# Altium footprint library Capacitor.PcbLib: 119 footprints (part 1 of 8)
Each footprint in its own frame and in the unit in brackets; x right, y up, seen from the top. Pads: shape width x height; smd on the part's side, far side on the other; paste and mask are expansions set on the pad; w line width, h text height; cw(c..) or ccw(c..) is an arc to the next point about the centre after c.
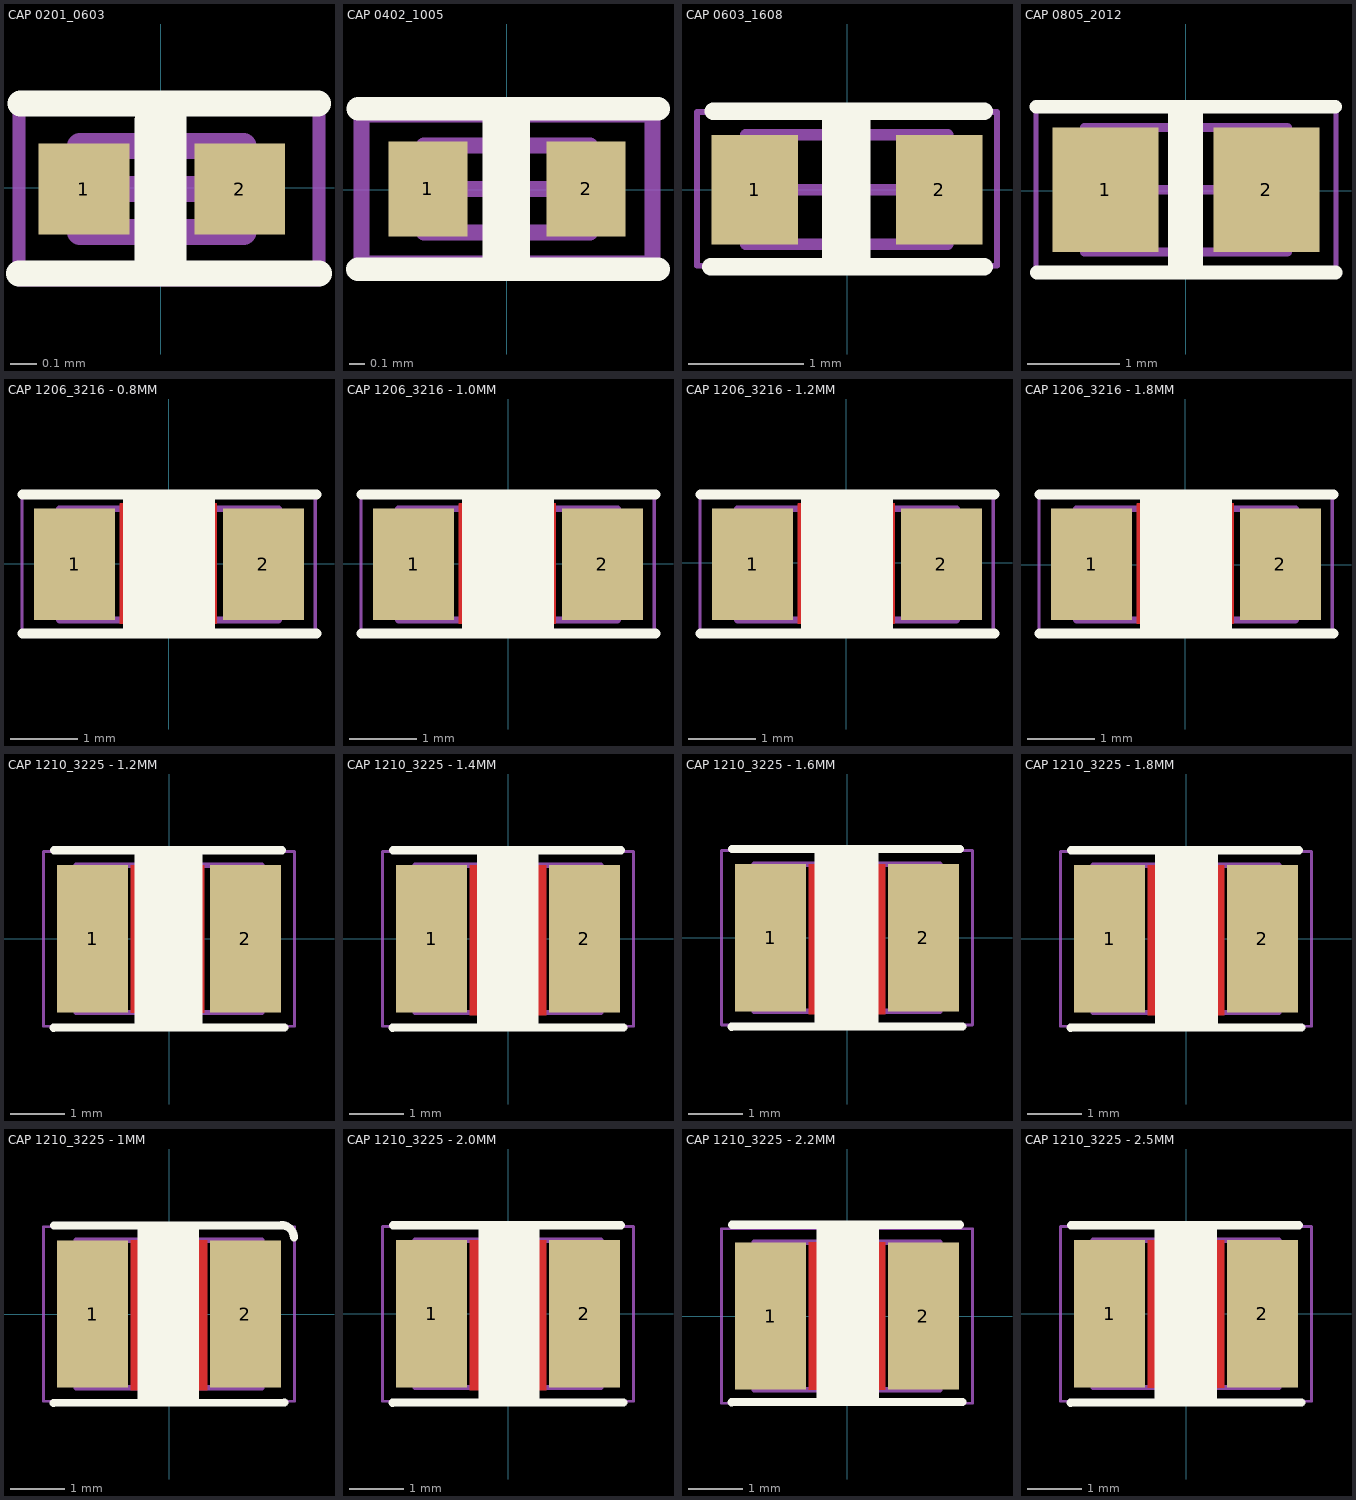
[diagram p0: the footprints below, top view; thin cyan lines are the x and y axes]

## CAP 0201_0603 [mm] "Chip Capacitor, 2-Leads, Body 0.60x0.30mm, IPC Medium Density"
height 0.33
pads (2):
  rect 0.35x0.35 smd: 1(-0.295,-0.004) 2(0.305,-0.004)
Top Overlay:
  lines w0.1: -0.545,-0.329 0.61,-0.329 ; -0.54,0.326 0.606,0.326 0.235,0.326 ; -0.05,-0.31 -0.05,0.26 -0.02,0.29 ; 0,-0.28 0,0.32 ; 0.05,-0.31 0.05,0.27
Mechanical 13:
  lines w0.1: -0.31,-0.169 -0.31,0.161 0.32,0.161 0.32,-0.169 -0.31,-0.169
Mechanical 15:
  lines w0.05: -0.545,-0.354 0.61,-0.354 0.61,0.346 -0.545,0.346 -0.545,-0.354
  lines w0.1: -0.16,-0.004 0.17,-0.004 ; 0.005,-0.169 0.005,0.161
3D body "CAP 0201.STEP": height 0.3, standoff 0, extent -0.3,-0.15 0.3,0.15

## CAP 0402_1005 [mm] "Chip Capacitor, 2-Leads, Body 1.02x0.51mm, IPC Medium Density"
height 0.52
pads (2):
  rect 0.5x0.6 smd: 1(-0.498,0.006) 2(0.502,0.006)
Top Overlay:
  lines w0.15: -0.941,-0.502 0.957,-0.502 ; -0.939,0.514 0.957,0.514 ; -0.077,-0.493 -0.077,0.496 ; 0.002,-0.502 0.002,0.514 ; 0.073,-0.503 0.073,0.513
Mechanical 13:
  lines w0.1: -0.523,-0.269 0.527,-0.269 0.527,0.281 -0.523,0.281 -0.523,-0.269
Mechanical 15:
  lines w0.1: -0.273,0.006 0.277,0.006 ; 0.002,-0.269 0.002,0.281 ; -0.918,-0.464 0.922,-0.464 0.922,0.476 -0.918,0.476 -0.918,-0.464
3D body "0402 cap.STEP": height 0.52, standoff 0, extent -0.52,-0.272 0.48,0.252

## CAP 0603_1608 [mm] "Chip Capacitor, 2-Leads, Body 1.60x0.80mm, IPC Medium Density"
height 0.89
pads (2):
  rect 0.75x0.95 smd: 1(-0.8,0) 2(0.8,0)
Top Overlay:
  lines w0.15: -1.18,-0.665 1.19,-0.665 ; -1.16,0.68 1.19,0.68 ; -0.141,-0.643 -0.141,0.653 ; -0.002,-0.665 -0.002,0.68 ; 0.129,-0.663 0.129,0.641
Mechanical 13:
  lines w0.1: -0.877,-0.473 -0.877,0.477 0.873,0.477 0.873,-0.473 -0.877,-0.473
Mechanical 15:
  lines w0.05: -1.3,-0.658 -1.3,0.675 1.3,0.675 1.3,-0.658 -1.3,-0.658
  lines w0.1: -0.477,0.002 0.473,0.002 ; -0.002,-0.473 -0.002,0.477
3D body "0603 cap.STEP": height 0.82, standoff 0, extent -0.8,-0.404 0.8,0.42

## CAP 0805_2012 [mm] "Chip Capacitor, 2-Leads, Body 2.00x1.20mm, IPC Medium Density"
height 1.15
pads (2):
  rect 1.15x1.35 smd: 1(-0.875,0.01) 2(0.875,0.01)
Top Overlay:
  lines w0.15: -1.624,0.91 1.622,0.91 ; -1.617,-0.89 1.626,-0.89 ; -0.12,-0.854 -0.12,0.9 ; 0,-0.89 0,0.91 ; 0.11,-0.878 0.11,0.9
Mechanical 13:
  lines w0.1: -1.1,-0.665 1.1,-0.665 1.1,0.685 -1.1,0.685 -1.1,-0.665
Mechanical 15:
  lines w0.05: -1.628,-0.89 1.63,-0.89 1.63,0.925 -1.628,0.925 -1.628,-0.89
  lines w0.1: -0.5,0.01 0.5,0.01 ; 0,-0.49 0,0.51
3D body "0805 cap.STEP": height 1.26, standoff -0.02, extent -0.99,-0.654 1.01,0.62

## CAP 1206_3216 - 0.8MM [mm] "Chip Capacitor, 2-Leads, Body 3.25x1.60mm, IPC Medium Density"
height 0.8
pads (2):
  rect 1.2x1.65 smd: 1(-1.396,-0.009) 2(1.404,-0.009)
Top Layer:
  pour cut-out: -0.726,0.891 -0.716,0.901 0.714,0.901 0.714,-0.879 0.704,-0.889 -0.726,-0.889
Top Overlay:
  rectangle: -0.68,-0.99 0.69,0.98
  lines w0.15: -2.17,-1.037 2.192,-1.037 ; -2.17,1.029 2.19,1.029
Mechanical 13:
  lines w0.1: -1.621,-0.834 -1.621,0.816 1.629,0.816 1.629,-0.834 -1.621,-0.834
Mechanical 15:
  lines w0.05: -2.176,-1.029 -2.176,1.021 2.174,1.021 2.174,-1.029 -2.176,-1.029
  lines w0.1: -0.496,-0.009 0.504,-0.009 ; 0.004,-0.509 0.004,0.491
3D body "CAP 1206-0.8mm.STEP": height 0.8, standoff 0, extent -1.66,-0.81 1.54,0.79

## CAP 1206_3216 - 1.0MM [mm] "Chip Capacitor, 2-Leads, Body 3.25x1.60mm, IPC Medium Density"
height 1
pads (2):
  rect 1.2x1.65 smd: 1(-1.401,-0.011) 2(1.399,-0.011)
Top Layer:
  pour cut-out: -0.731,0.889 -0.721,0.899 0.709,0.899 0.709,-0.881 0.699,-0.891 -0.731,-0.891
Top Overlay:
  rectangle: -0.685,-0.992 0.685,0.978
  lines w0.15: -2.175,-1.039 2.187,-1.039 ; -2.175,1.027 2.185,1.027
Mechanical 13:
  lines w0.1: -1.626,-0.836 -1.626,0.814 1.624,0.814 1.624,-0.836 -1.626,-0.836
Mechanical 15:
  lines w0.05: -2.181,-1.031 -2.181,1.019 2.169,1.019 2.169,-1.031 -2.181,-1.031
  lines w0.1: -0.501,-0.011 0.499,-0.011 ; -0.001,-0.511 -0.001,0.489
3D body "CAP 1206-1mm.STEP": height 1, standoff 0, extent -1.58,-0.79 1.62,0.81

## CAP 1206_3216 - 1.2MM [mm] "Chip Capacitor, 2-Leads, Body 3.25x1.60mm, IPC Medium Density"
height 1.2
pads (2):
  rect 1.2x1.65 smd: 1(-1.391,-0.021) 2(1.409,-0.021)
Top Layer:
  pour cut-out: -0.721,0.879 -0.711,0.889 0.719,0.889 0.719,-0.891 0.709,-0.901 -0.721,-0.901
Top Overlay:
  rectangle: -0.675,-1.002 0.695,0.968
  lines w0.15: -2.165,-1.049 2.197,-1.049 ; -2.165,1.017 2.195,1.017
Mechanical 13:
  lines w0.1: -1.616,-0.846 -1.616,0.804 1.634,0.804 1.634,-0.846 -1.616,-0.846
Mechanical 15:
  lines w0.05: -2.171,-1.041 -2.171,1.009 2.179,1.009 2.179,-1.041 -2.171,-1.041
  lines w0.1: -0.491,-0.021 0.509,-0.021 ; 0.009,-0.521 0.009,0.479
3D body "CAP 1206-1.2mm.STEP": height 1.2, standoff 0, extent -1.55,-0.82 1.65,0.78

## CAP 1206_3216 - 1.8MM [mm] "Chip Capacitor, 2-Leads, Body 3.25x1.60mm, IPC Medium Density"
height 1.8
pads (2):
  rect 1.2x1.65 smd: 1(-1.391,0.009) 2(1.409,0.009)
Top Layer:
  pour cut-out: -0.721,0.909 -0.711,0.919 0.719,0.919 0.719,-0.861 0.709,-0.871 -0.721,-0.871
Top Overlay:
  rectangle: -0.675,-0.972 0.695,0.998
  lines w0.15: -2.165,-1.019 2.197,-1.019 ; -2.165,1.047 2.195,1.047
Mechanical 13:
  lines w0.1: -1.616,-0.816 -1.616,0.834 1.634,0.834 1.634,-0.816 -1.616,-0.816
Mechanical 15:
  lines w0.05: -2.171,-1.011 -2.171,1.039 2.179,1.039 2.179,-1.011 -2.171,-1.011
  lines w0.1: -0.491,0.009 0.509,0.009 ; 0.009,-0.491 0.009,0.509
3D body "CAP 1206-1.8mm.STEP": height 1.8, standoff 0, extent -1.57,-0.77 1.63,0.83

## CAP 1210_3225 - 1.2MM [mm] "Chip Capacitor, 2-Leads, Body 3.20x2.50mm, IPC Medium Density"
height 1.2
pads (2):
  rect 1.3x2.7 smd: 1(-1.4,0) 2(1.4,0)
Top Layer:
  pour cut-out: -0.7,1.35 0.65,1.35 0.65,-1.35 -0.7,-1.35
Top Overlay:
  rectangle: -0.63,-1.59 0.61,1.59
  lines w0.15: -2.12,-1.63 2.12,-1.625 ; -2.11,1.625 2.07,1.625 ; 0,-1.625 0,1.625
Mechanical 13:
  lines w0.1: -1.7,-1.35 1.7,-1.35 1.7,1.35 -1.7,1.35 -1.7,-1.35
Mechanical 15:
  lines w0.05: -2.3,-1.6 2.3,-1.6 2.3,1.6 -2.3,1.6 -2.3,-1.6
  lines w0.1: -0.5,0 0.5,0 ; 0,-0.5 0,0.5
3D body "CAP 1210-1.2mm.STEP": height 1.2, standoff 0, extent -1.6,-1.25 1.6,1.25

## CAP 1210_3225 - 1.4MM [mm] "Chip Capacitor, 2-Leads, Body 3.20x2.50mm, IPC Medium Density"
height 1.4
pads (2):
  rect 1.3x2.7 smd: 1(-1.4,0) 2(1.4,0)
Top Layer:
  pour cut-out: 0.7,1.35 0.7,-1.4 -0.7,-1.4 -0.7,1.35
Top Overlay:
  rectangle: -0.57,-1.63 0.56,1.62
  lines w0.15: -2.12,-1.63 2.12,-1.625 ; -2.11,1.625 2.07,1.625 ; 0,-1.625 0,1.625
Mechanical 13:
  lines w0.1: -1.7,-1.35 -1.7,1.35 1.7,1.35 1.7,-1.35 -1.7,-1.35
Mechanical 15:
  lines w0.05: -2.3,-1.6 -2.3,1.6 2.3,1.6 2.3,-1.6 -2.3,-1.6
  lines w0.1: -0.5,0 0.5,0 ; 0,-0.5 0,0.5
3D body "CAP 1210-1.4mm.STEP": height 1.4, standoff 0, extent -1.6,-1.25 1.6,1.25

## CAP 1210_3225 - 1.6MM [mm] "Chip Capacitor, 2-Leads, Body 3.20x2.50mm, IPC Medium Density"
height 1.6
pads (2):
  rect 1.3x2.7 smd: 1(-1.4,0) 2(1.4,0)
Top Layer:
  pour cut-out: -0.7,1.35 0.7,1.35 0.7,-1.4 -0.7,-1.4
Top Overlay:
  rectangle: -0.6,-1.67 0.58,1.59
  lines w0.15: -2.12,-1.63 2.12,-1.625 ; -2.11,1.625 2.07,1.625 ; 0,-1.625 0,1.625
Mechanical 13:
  lines w0.1: -1.7,-1.35 -1.7,1.35 1.7,1.35 1.7,-1.35 -1.7,-1.35
Mechanical 15:
  lines w0.05: -2.3,-1.6 -2.3,1.6 2.3,1.6 2.3,-1.6 -2.3,-1.6
  lines w0.1: -0.5,0 0.5,0 ; 0,-0.5 0,0.5
3D body "CAP 1210-1.6mm.STEP": height 1.6, standoff 0, extent -1.6,-1.25 1.6,1.25

## CAP 1210_3225 - 1.8MM [mm] "Chip Capacitor, 2-Leads, Body 3.20x2.50mm, IPC Medium Density"
height 1.8
pads (2):
  rect 1.3x2.7 smd: 1(-1.4,0) 2(1.4,0)
Top Layer:
  pour cut-out: -0.7,1.35 0.7,1.35 0.7,-1.4 -0.7,-1.4
Top Overlay:
  rectangle: -0.57,-1.62 0.59,1.61
  lines w0.15: -2.12,-1.63 2.12,-1.625 ; -2.11,1.625 2.07,1.625 ; 0,-1.625 0,1.625
Mechanical 13:
  lines w0.1: -1.7,-1.35 -1.7,1.35 1.7,1.35 1.7,-1.35 -1.7,-1.35
Mechanical 15:
  lines w0.05: -2.3,-1.6 -2.3,1.6 2.3,1.6 2.3,-1.6 -2.3,-1.6
  lines w0.1: -0.5,0 0.5,0 ; 0,-0.5 0,0.5
3D body "CAP 1210-1.8mm.STEP": height 1.8, standoff 0, extent -1.6,-1.25 1.6,1.25

## CAP 1210_3225 - 1MM [mm] "Chip Capacitor, 2-Leads, Body 3.20x2.50mm, IPC Medium Density"
height 1
pads (2):
  rect 1.3x2.7 smd: 1(-1.4,0) 2(1.4,0)
Top Layer:
  pour cut-out: -0.7,1.35 0.7,1.35 0.7,-1.4 -0.7,-1.4
Top Overlay:
  rectangle: -0.58,-1.6 0.55,1.58
  lines w0.15: -2.12,-1.63 2.12,-1.625 ; -2.11,1.625 2.07,1.625 ; 0,-1.625 0,1.625 ; 2.06,1.63 cw(c2.06,1.4) 2.29,1.4
Mechanical 13:
  lines w0.1: -1.7,-1.35 1.7,-1.35 1.7,1.35 -1.7,1.35 -1.7,-1.35
Mechanical 15:
  lines w0.05: -2.3,-1.6 2.3,-1.6 2.3,1.6 -2.3,1.6 -2.3,-1.6
  lines w0.1: -0.5,0 0.5,0 ; 0,-0.5 0,0.5
3D body "CAP 1210-1mm.STEP": height 1, standoff 0, extent -1.6,-1.25 1.6,1.25

## CAP 1210_3225 - 2.0MM [mm] "Chip Capacitor, 2-Leads, Body 3.20x2.50mm, IPC Medium Density"
height 2
pads (2):
  rect 1.3x2.7 smd: 1(-1.4,0) 2(1.4,0)
Top Layer:
  pour cut-out: -0.7,1.35 0.7,1.35 0.7,-1.4 -0.7,-1.4
Top Overlay:
  rectangle: -0.54,-1.59 0.58,1.6
  lines w0.15: -2.12,-1.63 2.12,-1.625 ; -2.11,1.625 2.07,1.625 ; 0,-1.625 0,1.625
Mechanical 13:
  lines w0.1: -1.7,-1.35 1.7,-1.35 1.7,1.35 -1.7,1.35 -1.7,-1.35
Mechanical 15:
  lines w0.05: -2.3,-1.6 2.3,-1.6 2.3,1.6 -2.3,1.6 -2.3,-1.6
  lines w0.1: -0.5,0 0.5,0 ; 0,-0.5 0,0.5
3D body "CAP 1210-2.0mm.STEP": height 2, standoff 0, extent -1.6,-1.25 1.6,1.25

## CAP 1210_3225 - 2.2MM [mm] "Chip Capacitor, 2-Leads, Body 3.20x2.50mm, IPC Medium Density"
height 2.2
pads (2):
  rect 1.3x2.7 smd: 1(-1.4,0) 2(1.4,0)
Top Layer:
  pour cut-out: -0.7,1.35 0.7,1.35 0.7,-1.35 -0.7,-1.35
Top Overlay:
  rectangle: -0.56,-1.53 0.59,1.66
  lines w0.15: -2.12,-1.58 2.12,-1.575 ; -2.11,1.675 2.07,1.675 ; 0,-1.575 0,1.675
Mechanical 13:
  lines w0.1: -1.7,-1.35 -1.7,1.35 1.7,1.35 1.7,-1.35 -1.7,-1.35
Mechanical 15:
  lines w0.05: -2.3,-1.6 -2.3,1.6 2.3,1.6 2.3,-1.6 -2.3,-1.6
  lines w0.1: -0.5,0 0.5,0 ; 0,-0.5 0,0.5
3D body "CAP 1210-2.2mm.STEP": height 2.2, standoff 0, extent -1.6,-1.25 1.6,1.25

## CAP 1210_3225 - 2.5MM [mm] "Chip Capacitor, 2-Leads, Body 3.20x2.50mm, IPC Medium Density"
height 2.5
pads (2):
  rect 1.3x2.7 smd: 1(-1.4,0) 2(1.4,0)
Top Layer:
  pour cut-out: -0.7,1.35 0.7,1.35 0.7,-1.35 -0.7,-1.35
Top Overlay:
  rectangle: -0.58,-1.62 0.57,1.61
  lines w0.15: -2.12,-1.63 2.12,-1.625 ; -2.11,1.625 2.07,1.625 ; 0,-1.625 0,1.625
Mechanical 13:
  lines w0.1: -1.7,-1.35 1.7,-1.35 1.7,1.35 -1.7,1.35 -1.7,-1.35
Mechanical 15:
  lines w0.05: -2.3,-1.6 2.3,-1.6 2.3,1.6 -2.3,1.6 -2.3,-1.6
  lines w0.1: -0.5,0 0.5,0 ; 0,-0.5 0,0.5
3D body "CAP 1210-2.5mm.STEP": height 2.5, standoff 0, extent -1.6,-1.25 1.6,1.25